# Altium footprint library IC.PcbLib: 108 footprints (part 3 of 8)
Each footprint in its own frame and in the unit in brackets; x right, y up, seen from the top. Pads: shape width x height; smd on the part's side, far side on the other; paste and mask are expansions set on the pad; w line width, h text height; cw(c..) or ccw(c..) is an arc to the next point about the centre after c.
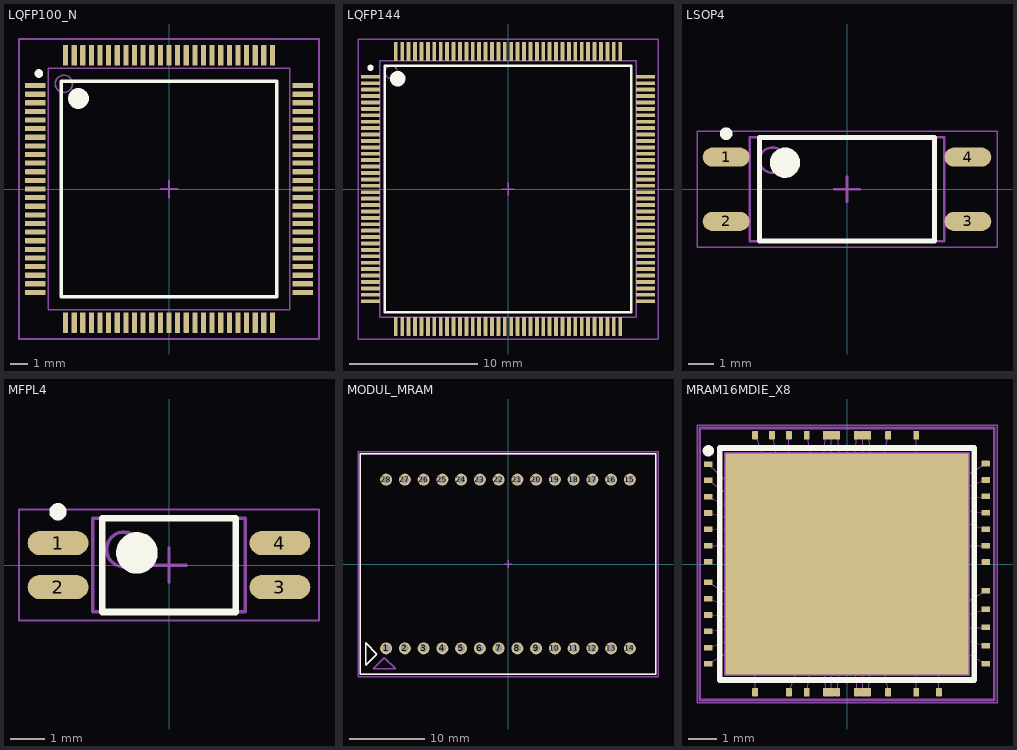
[diagram p2: the footprints below, top view; thin cyan lines are the x and y axes]

## LQFP100_N [mm] "Thin QFP, 100-Leads, Body 14x14mm, Pitch 0.5mm, IPC Medium Density"
height 1.6
pads (100):
  rrect20% 1.2x0.3 smd: 1(-7.75,6) 2(-7.75,5.5) 3(-7.75,5) 4(-7.75,4.5) 5(-7.75,4) 6(-7.75,3.5) 7(-7.75,3) 8(-7.75,2.5) 9(-7.75,2) 10(-7.75,1.5) 11(-7.75,1) 12(-7.75,0.5) 13(-7.75,0) 14(-7.75,-0.5) 15(-7.75,-1) 16(-7.75,-1.5) 17(-7.75,-2) 18(-7.75,-2.5) 19(-7.75,-3) 20(-7.75,-3.5) 21(-7.75,-4) 22(-7.75,-4.5) 23(-7.75,-5) 24(-7.75,-5.5) 25(-7.75,-6) 51(7.75,-6) 52(7.75,-5.5) 53(7.75,-5) 54(7.75,-4.5) 55(7.75,-4) 56(7.75,-3.5) 57(7.75,-3) 58(7.75,-2.5) 59(7.75,-2) 60(7.75,-1.5) 61(7.75,-1) 62(7.75,-0.5) 63(7.75,0) 64(7.75,0.5) 65(7.75,1) 66(7.75,1.5) 67(7.75,2) 68(7.75,2.5) 69(7.75,3) 70(7.75,3.5) 71(7.75,4) 72(7.75,4.5) 73(7.75,5) 74(7.75,5.5) 75(7.75,6)
  rrect20% 0.3x1.2 smd: 26(-6,-7.75) 27(-5.5,-7.75) 28(-5,-7.75) 29(-4.5,-7.75) 30(-4,-7.75) 31(-3.5,-7.75) 32(-3,-7.75) 33(-2.5,-7.75) 34(-2,-7.75) 35(-1.5,-7.75) 36(-1,-7.75) 37(-0.5,-7.75) 38(0,-7.75) 39(0.5,-7.75) 40(1,-7.75) 41(1.5,-7.75) 42(2,-7.75) 43(2.5,-7.75) 44(3,-7.75) 45(3.5,-7.75) 46(4,-7.75) 47(4.5,-7.75) 48(5,-7.75) 49(5.5,-7.75) 50(6,-7.75) 76(6,7.75) 77(5.5,7.75) 78(5,7.75) 79(4.5,7.75) 80(4,7.75) 81(3.5,7.75) 82(3,7.75) 83(2.5,7.75) 84(2,7.75) 85(1.5,7.75) 86(1,7.75) 87(0.5,7.75) 88(0,7.75) 89(-0.5,7.75) 90(-1,7.75) 91(-1.5,7.75) 92(-2,7.75) 93(-2.5,7.75) 94(-3,7.75) 95(-3.5,7.75) 96(-4,7.75) 97(-4.5,7.75) 98(-5,7.75) 99(-5.5,7.75) 100(-6,7.75)
Top Overlay:
  circle w0.25: c-7.55,6.7 r0.125
  circle w0.6: c-5.25,5.25 r0.3
  lines w0.2: -6.25,-6.25 -6.25,6.25 6.25,6.25 6.25,-6.25 -6.25,-6.25
M3_comm_top:
  text ".comment" at -3,-0.5 h2
M5_asm_top:
  circle w0.1: c-6.1,6.1 r0.5
  lines w0.1: -7,-7 -7,7 7,7 7,-7 -7,-7
  text ".Designator" at -2,5.5 h2
M7_courtyard_top:
  lines w0.1: -0.5,0 0.5,0 ; 0,-0.5 0,0.5 ; -8.7,-8.7 -8.7,8.7 8.7,8.7 8.7,-8.7 -8.7,-8.7
3D body "User Library-LQFP100_Grid_0_5.STEP": height 1.6, standoff 0, extent -8,-8 8,8

## LQFP144 [mm] "K1986BE1QI, STM32F407ZET6, TSQFP, 144-Leads, Body 20,00x20,00mm, Pitch 0,50mm, IPC Medium Density"
height 1.6
pads (144):
  rrect20% 1.45x0.3 smd: 1(-10.725,8.75) 2(-10.725,8.25) 3(-10.725,7.75) 4(-10.725,7.25) 5(-10.725,6.75) 6(-10.725,6.25) 7(-10.725,5.75) 8(-10.725,5.25) 9(-10.725,4.75) 10(-10.725,4.25) 11(-10.725,3.75) 12(-10.725,3.25) 13(-10.725,2.75) 14(-10.725,2.25) 15(-10.725,1.75) 16(-10.725,1.25) 17(-10.725,0.75) 18(-10.725,0.25) 19(-10.725,-0.25) 20(-10.725,-0.75) 21(-10.725,-1.25) 22(-10.725,-1.75) 23(-10.725,-2.25) 24(-10.725,-2.75) 25(-10.725,-3.25) 26(-10.725,-3.75) 27(-10.725,-4.25) 28(-10.725,-4.75) 29(-10.725,-5.25) 30(-10.725,-5.75) 31(-10.725,-6.25) 32(-10.725,-6.75) 33(-10.725,-7.25) 34(-10.725,-7.75) 35(-10.725,-8.25) 36(-10.725,-8.75) 73(10.725,-8.75) 74(10.725,-8.25) 75(10.725,-7.75) 76(10.725,-7.25) 77(10.725,-6.75) 78(10.725,-6.25) 79(10.725,-5.75) 80(10.725,-5.25) 81(10.725,-4.75) 82(10.725,-4.25) 83(10.725,-3.75) 84(10.725,-3.25) 85(10.725,-2.75) 86(10.725,-2.25) 87(10.725,-1.75) 88(10.725,-1.25) 89(10.725,-0.75) 90(10.725,-0.25) 91(10.725,0.25) 92(10.725,0.75) 93(10.725,1.25) 94(10.725,1.75) 95(10.725,2.25) 96(10.725,2.75) 97(10.725,3.25) 98(10.725,3.75) 99(10.725,4.25) 100(10.725,4.75) 101(10.725,5.25) 102(10.725,5.75) 103(10.725,6.25) 104(10.725,6.75) 105(10.725,7.25) 106(10.725,7.75) 107(10.725,8.25) 108(10.725,8.75)
  rrect20% 0.3x1.45 smd: 37(-8.75,-10.725) 38(-8.25,-10.725) 39(-7.75,-10.725) 40(-7.25,-10.725) 41(-6.75,-10.725) 42(-6.25,-10.725) 43(-5.75,-10.725) 44(-5.25,-10.725) 45(-4.75,-10.725) 46(-4.25,-10.725) 47(-3.75,-10.725) 48(-3.25,-10.725) 49(-2.75,-10.725) 50(-2.25,-10.725) 51(-1.75,-10.725) 52(-1.25,-10.725) 53(-0.75,-10.725) 54(-0.25,-10.725) 55(0.25,-10.725) 56(0.75,-10.725) 57(1.25,-10.725) 58(1.75,-10.725) 59(2.25,-10.725) 60(2.75,-10.725) 61(3.25,-10.725) 62(3.75,-10.725) 63(4.25,-10.725) 64(4.75,-10.725) 65(5.25,-10.725) 66(5.75,-10.725) 67(6.25,-10.725) 68(6.75,-10.725) 69(7.25,-10.725) 70(7.75,-10.725) 71(8.25,-10.725) 72(8.75,-10.725) 109(8.75,10.725) 110(8.25,10.725) 111(7.75,10.725) 112(7.25,10.725) 113(6.75,10.725) 114(6.25,10.725) 115(5.75,10.725) 116(5.25,10.725) 117(4.75,10.725) 118(4.25,10.725) 119(3.75,10.725) 120(3.25,10.725) 121(2.75,10.725) 122(2.25,10.725) 123(1.75,10.725) 124(1.25,10.725) 125(0.75,10.725) 126(0.25,10.725) 127(-0.25,10.725) 128(-0.75,10.725) 129(-1.25,10.725) 130(-1.75,10.725) 131(-2.25,10.725) 132(-2.75,10.725) 133(-3.25,10.725) 134(-3.75,10.725) 135(-4.25,10.725) 136(-4.75,10.725) 137(-5.25,10.725) 138(-5.75,10.725) 139(-6.25,10.725) 140(-6.75,10.725) 141(-7.25,10.725) 142(-7.75,10.725) 143(-8.25,10.725) 144(-8.75,10.725)
Top Overlay:
  circle w0.25: c-10.725,9.45 r0.125
  circle w0.6: c-8.6,8.6 r0.3
  lines w0.2: -9.6,-9.6 -9.6,9.6 9.6,9.6 9.6,-9.6 -9.6,-9.6
M3_comm_top:
  text ".comment" at -2.95,-0.475 h1
M5_asm_top:
  circle w0.1: c-9.1,9.1 r0.5
  lines w0.1: -10,-10 -10,10 10,10 10,-10 -10,-10
  text ".Designator" at -0.6,12 h1
M7_courtyard_top:
  lines w0.1: -0.5,0 0.5,0 ; 0,-0.5 0,0.5 ; -11.7,-11.7 -11.7,11.7 11.7,11.7 11.7,-11.7 -11.7,-11.7
3D body "TSQFP50P2200X2200X160-144N.step": height 1.6, standoff 0, extent -11,-11 11,11

## LSOP4 [mm] "SOP, IPC Medium Density"
height 2.3
pads (4):
  oval 1.85x0.75 smd: 1(-4.775,1.27) 2(-4.775,-1.27) 3(4.775,-1.27) 4(4.775,1.27)
Top Overlay:
  circle w0.25: c-4.775,2.195 r0.125
  circle w0.6: c-2.45,1.05 r0.3
  lines w0.2: -3.45,-2.05 -3.45,2.05 3.45,2.05 3.45,-2.05 -3.45,-2.05
Mechanical 13:
  circle w0.1: c-2.95,1.15 r0.5
  lines w0.1: -3.85,-2.05 -3.85,2.05 3.85,2.05 3.85,-2.05 -3.85,-2.05
Mechanical 15:
  lines w0.05: -5.925,-2.3 -5.925,2.3 5.925,2.3 5.925,-2.3 -5.925,-2.3
  lines w0.1: -0.5,0 0.5,0 ; 0,-0.5 0,0.5
3D body "LSOP4.step": height 2.3, standoff 0, extent -5.25,-2.05 5.25,2.05

## MFPL4 [mm] "SOP, IPC Medium Density"
height 2.39
pads (4):
  oval 1.75x0.7 smd: 1(-3.2,0.635) 2(-3.2,-0.635) 3(3.2,-0.635) 4(3.2,0.635)
Top Overlay:
  circle w0.25: c-3.2,1.535 r0.125
  circle w0.6: c-0.925,0.35 r0.3
  lines w0.2: -1.925,-1.35 -1.925,1.35 1.925,1.35 1.925,-1.35 -1.925,-1.35
Mechanical 13:
  circle w0.1: c-1.3,0.45 r0.5
  lines w0.1: -2.2,-1.35 -2.2,1.35 2.2,1.35 2.2,-1.35 -2.2,-1.35
Mechanical 15:
  lines w0.05: -4.325,-1.6 -4.325,1.6 4.325,1.6 4.325,-1.6 -4.325,-1.6
  lines w0.1: -0.5,0 0.5,0 ; 0,-0.5 0,0.5
3D body "MFPL4.step": height 2.39, standoff 0, extent -3.65,-1.35 3.65,1.35

## MODUL_MRAM [mm]
pads (28):
  round 1.6 hole 1: 1(-16.25,-11.25) 2(-13.75,-11.25) 3(-11.25,-11.25) 4(-8.75,-11.25) 5(-6.25,-11.25) 6(-3.75,-11.25) 7(-1.25,-11.25) 8(1.25,-11.25) 9(3.75,-11.25) 10(6.25,-11.25) 11(8.75,-11.25) 12(11.25,-11.25) 13(13.75,-11.25) 14(16.25,-11.25) 15(16.25,11.25) 16(13.75,11.25) 17(11.25,11.25) 18(8.75,11.25) 19(6.25,11.25) 20(3.75,11.25) 21(1.25,11.25) 22(-1.25,11.25) 23(-3.75,11.25) 24(-6.25,11.25) 25(-8.75,11.25) 26(-11.25,11.25) 27(-13.75,11.25) 28(-16.25,11.25)
Top Overlay:
  lines w0.2: -19.7,-14.7 -19.7,14.7 19.7,14.7 19.7,-14.7 -19.7,-14.7 ; -19,-13.5 -17.5,-12 -19,-10.5 -19,-13.5
M3_comm_top:
  text ".comment" at -3,-0.5 h2
M5_asm_top:
  lines w0.2: -19.7,-14.7 19.7,-14.7 19.7,14.7 -19.7,14.7 -19.7,-14.7 ; -18,-14 -15,-14 -16.5,-12.5 -18,-14
  text ".Designator" at -3.5,15 h2
M7_courtyard_top:
  lines w0.2: -0.5,0 0.5,0 ; 0,-0.5 0,0.5 ; -20,-15 -20,15 20,15 20,-15 -20,-15
3D body "1210.15-5.STEP": height 1.85, standoff -7.75, extent -19.675,-14.675 19.675,14.675
3D body "lead_1210.15-5.STEP": height 5.8, standoff 1, extent -19.675,-14.65 19.675,14.65

## MRAM16MDIE_X8 [mm] "MRAM16MDIE"
height 1.75
pads (194):
  rrect50% 0.15x0.15 on Mech16: 9(-3.905,-2.95) 9(-3.905,-2.6) 9(-3.905,-2.25) 9(-3.905,-1.9) 9(-3.905,-1.55) 9(-3.905,-1.25) 9(-3.905,-0.95) 9(-3.905,-0.65) 9(-3.905,-0.35) 9(-3.905,0.35) 9(-3.905,0.65) 9(-3.905,0.95) 9(-3.905,1.25) 9(-3.905,1.55) 9(-3.905,1.9) 9(-3.905,2.25) 9(-3.905,2.6) 9(-3.905,2.95) 9(-3.25,-3.53) 9(-3.25,3.53) 9(-2.85,-3.53) 9(-2.85,3.53) 9(-2.45,-3.53) 9(-2.45,3.53) 9(-2.05,-3.53) 9(-2.05,3.53) 9(-1.65,-3.53) 9(-1.65,3.53) 9(-1.25,-3.53) 9(-1.25,3.53) 9(-0.85,-3.53) 9(-0.85,3.53) 9(-0.55,-3.53) 9(-0.55,3.53) 9(-0.25,-3.53) 9(-0.25,3.53) 9(0.25,-3.53) 9(0.25,3.53) 9(0.55,-3.53) 9(0.55,3.53) 9(0.85,-3.53) 9(0.85,3.53) 9(1.25,-3.53) 9(1.25,3.53) 9(1.65,-3.53) 9(1.65,3.53) 9(2.05,-3.53) 9(2.05,3.53) 9(2.45,-3.53) 9(2.45,3.53) 9(2.85,-3.53) 9(2.85,3.53) 9(3.25,-3.53) 9(3.25,3.53) 9(3.905,-2.95) 9(3.905,-2.6) 9(3.905,-2.25) 9(3.905,-1.9) 9(3.905,-1.55) 9(3.905,-1.25) 9(3.905,-0.95) 9(3.905,-0.65) 9(3.905,-0.35) 9(3.905,0.35) 9(3.905,0.65) 9(3.905,0.95) 9(3.905,1.25) 9(3.905,1.55) 9(3.905,1.9) 9(3.905,2.25) 9(3.905,2.6) 9(3.905,2.95)
  rrect20% 0.3x0.2 smd paste-0.15: A2(-4.905,3.53) A3(-4.905,-1.226) A4(-4.905,-1.802) A5(-4.905,-2.378) B3(-4.905,-2.954) B4(-4.905,-3.53) C3(4.9,-3.53) C4(4.905,-2.885) D3(-4.905,1.802) D4(4.905,-2.24) E1(-4.905,0.65) E1(4.91,0.07) E4(-4.905,2.378) E6(-4.905,0.074) E6(4.905,0.65) F3(4.9,3.55) F4(-4.905,2.954) G3(4.905,2.39) G4(4.905,2.97) H1(-4.905,1.226) H2(4.905,-1.595) H3(4.9,-0.95) H4(4.9,1.23) H5(4.905,1.81) H6(-4.9,-0.65)
  rrect20% 0.2x0.3 smd paste-0.15: B5(-3.25,-4.53) C1(2.45,4.55) C6(-2.05,-4.53) D1(-0.75,4.55) D1(-0.55,4.55) D1(-0.35,4.55) D2(1.45,4.55) D5(-1.425,-4.53) D6(0.35,4.55) D6(0.55,4.55) D6(0.75,4.55) E1(-0.75,-4.525) E1(-0.55,-4.53) E1(-0.35,-4.525) E2(-1.425,4.55) E5(1.45,-4.53) E6(0.35,-4.525) E6(0.55,-4.53) E6(0.75,-4.525) F1(-2.65,4.55) F2(-2.05,4.55) F6(2.45,-4.53) G2(-3.25,4.55) G5(3.25,-4.53)
  rrect25% 0.12x0.12 on Mech13: ""(-3.909,2.6) ""(-3.905,-2.95) ""(-3.905,-2.25) ""(-3.905,-1.9) ""(-3.905,-1.55) ""(-3.905,-1.25) ""(-3.905,-0.95) ""(-3.905,-0.65) ""(-3.905,-0.35) ""(-3.905,0.35) ""(-3.905,0.65) ""(-3.905,0.95) ""(-3.905,1.25) ""(-3.905,1.55) ""(-3.905,1.9) ""(-3.905,2.25) ""(-3.905,2.95) ""(-3.9,-2.6) ""(-3.25,-3.53) ""(-3.25,3.53) ""(-2.85,-3.53) ""(-2.85,3.53) ""(-2.45,-3.53) ""(-2.45,3.53) ""(-2.05,-3.53) ""(-2.05,3.53) ""(-1.65,-3.53) ""(-1.65,3.53) ""(-1.25,-3.53) ""(-1.25,3.53) ""(-0.85,-3.53) ""(-0.85,3.53) ""(-0.55,-3.53) ""(-0.55,3.53) ""(-0.25,-3.53) ""(-0.25,3.53) ""(0.25,-3.53) ""(0.25,3.53) ""(0.55,-3.53) ""(0.55,3.53) ""(0.85,-3.53) ""(0.85,3.53) ""(1.25,-3.53) ""(1.25,3.53) ""(1.65,-3.53) ""(1.65,3.53) ""(2.05,-3.53) ""(2.05,3.53) ""(2.45,-3.53) ""(2.45,3.53) ""(2.85,-3.53) ""(2.85,3.53) ""(3.25,-3.53) ""(3.25,3.53) ""(3.9,2.6) ""(3.905,-2.95) ""(3.905,-2.25) ""(3.905,-1.9) ""(3.905,-1.55) ""(3.905,-1.25) ""(3.905,-0.95) ""(3.905,-0.65) ""(3.905,-0.35) ""(3.905,0.35) ""(3.905,0.65) ""(3.905,0.95) ""(3.905,1.25) ""(3.905,1.55) ""(3.905,1.9) ""(3.905,2.25) ""(3.905,2.95) ""(3.909,-2.6)
  rect 8.6x7.8 smd: ""(0,0)
Top Overlay:
  circle w0.2: c-4.9,4 r0.1
  lines w0.2: -4.5,-4.1 -4.5,4.1 4.5,4.1 4.5,-4.1 -4.5,-4.1
M3_comm_top:
  text ".comment" at 0,0 h1
M5_asm_top:
  circle w0.15: c-4.9,4 r0.1
  lines w0.1: -4.5,-4.1 -4.5,4.1 4.5,4.1 4.5,-4.1 -4.5,-4.1
  text ".Designator" at -2,5 h1
M7_courtyard_top:
  lines w0.1: -0.5,0 0.5,0 ; 0,-0.5 0,0.5 ; -5.2,-4.8 -5.2,4.8 5.2,4.8 5.2,-4.8 -5.2,-4.8
Mechanical 13:
  circle w0.1: c-4,3.6 r0.1
  lines w0.01: -4.92,-1.226 -3.905,-1.55 ; -4.905,-3.53 -3.905,-2.95 ; -4.905,-2.953 -3.9,-2.6 ; -4.905,-2.378 -3.905,-2.25 ; -4.905,-1.802 -3.905,-1.9 ; -4.905,0.65 -3.905,0.65 ; -4.905,1.802 -3.905,1.55 ; -4.9,-0.65 -3.905,-1.25 ; -4.89,1.226 -3.905,1.243 ; -4.89,2.378 -3.914,1.899 ; -4.89,2.939 -3.905,2.25 ; -4.89,3.515 -3.909,2.6 ; -3.25,-4.53 -3.25,-3.53 ; -3.25,4.55 -2.85,3.53 ; -2.65,4.55 -2.45,3.53 ; -2.05,-4.53 -1.65,-3.53 ; -2.05,3.53 -2.05,4.55 ; -1.425,-4.53 -1.25,-3.53 ; -1.25,3.53 -1.425,4.55 ; -0.85,-3.53 -0.75,-4.525 ; -0.85,3.53 -0.75,4.55 ; -0.55,-4.53 -0.55,-3.53 ; -0.55,3.53 -0.55,4.55 ; -0.35,-4.525 -0.25,-3.53 ; -0.35,4.55 -0.25,3.53 ; 0.25,-3.53 0.35,-4.525 ; 0.25,3.53 0.35,4.55 ; 0.55,-4.53 0.55,-3.53 ; 0.55,3.53 0.55,4.55 ; 0.75,-4.525 0.85,-3.53 ; 0.75,4.55 0.85,3.53 ; 1.25,-3.53 1.45,-4.53 ; 1.25,3.53 1.45,4.549 ; 2.45,-4.53 2.45,-3.53 ; 2.45,3.53 2.45,4.55 ; 3.25,-4.53 3.25,-3.53 ; 3.9,2.6 4.905,2.97 ; 3.901,-1.902 4.905,-1.595 ; 3.904,-2.955 4.9,-3.53 ; 3.905,-2.25 4.905,-2.25 ; 3.905,-1.55 4.9,-0.95 ; 3.905,0.65 4.905,0.65 ; 3.905,1.55 4.9,1.23 ; 3.905,1.9 4.905,1.81 ; 3.905,2.25 4.905,2.39 ; 3.905,2.95 4.9,3.55 ; 3.909,-2.6 4.905,-2.885 ; -1.425,4.55 -1.425,4.55 ; -1.175,1.325 -1.175,1.6 1.175,1.6 1.175,1.325 ; -1.175,1.325 -1.175,0.65 1.175,0.65 1.175,1.325 ; -1.175,1.325 1.175,1.325
  lines w0.1: -4.3,-3.9 4.3,-3.9 4.3,3.9 -4.3,3.9 -4.3,-3.9
  text "X16" at 0.325,1.15 h0.2
  text "X8 BGA" at 0.325,0.95 h0.2
  text "X8 TSOP" at 0.325,0.75 h0.2
  text "1" at -0.85,0.75 h0.2
  text "0" at -0.175,0.75 h0.2
  text "0" at -0.85,0.95 h0.2
  text "1" at -0.175,0.95 h0.2
  text "0" at -0.85,1.15 h0.2
  text "0" at -0.175,1.15 h0.2
  text "bgax8" at -0.375,1.4 h0.2
  text "tsopx8" at -1.05,1.4 h0.2
  text "vddl" at -2,-3.45 h0.2
  text "ce2b" at -3.824,-1 h0.2
  text "nc_left1" at -3.824,-0.7 h0.2
  text "nc_left0" at -3.824,-0.4 h0.2
  text "vss_x8bga" at -3.824,0.3 h0.2
  text "vdd_x8bga" at -3.824,0.9 h0.2
  text "9" at -3.275,3.625 h0.2
  text "vdd" at 0.9,3.175 h0.2
  text "vdd" at 0.6,3.175 h0.2
  text "vdd" at 0.3,3.175 h0.2
  text "dq1" at 1.3,3.175 h0.2
  text "dq0" at 2.5,3.175 h0.2
  text "a14" at 3.525,2.875 h0.2
  text "a13" at 3.525,2.525 h0.2
  text "a12" at 3.525,2.175 h0.2
  text "a11" at 3.525,1.825 h0.2
  text "a10" at 3.525,1.475 h0.2
  text "vss" at 0.9,-3.45 h0.2
  text "vss" at 0.6,-3.45 h0.2
  text "vss" at 0.3,-3.45 h0.2
  text "vdd" at -0.2,-3.45 h0.2
  text "vdd" at -0.5,-3.45 h0.2
  text "vdd" at -0.8,-3.45 h0.2
  text "dq5" at -1.2,-3.45 h0.2
  text "dq4" at -1.6,-3.45 h0.2
  text "en" at -3.2,-3.45 h0.2
  text "a4" at -3.825,-3 h0.2
  text "a3" at -3.825,-2.65 h0.2
  text "a2" at -3.825,-2.3 h0.2
  text "a1" at -3.825,-1.95 h0.2
  text "a0" at -3.825,-1.6 h0.2
  text "a19" at -3.825,-1.3 h0.2
  text "bgax8" at -3.825,0.6 h0.2
  text "a18" at -3.825,1.2 h0.2
  text "a17" at -3.825,1.5 h0.2
  text "a16" at -3.825,1.85 h0.2
  text "a15" at -3.825,2.2 h0.2
  text "ng" at -3.825,2.55 h0.2
  text "a20" at -2.8,3.175 h0.2
  text "vss" at -0.2,3.175 h0.2
  text "vss" at -0.5,3.175 h0.2
  text "vss" at -0.8,3.175 h0.2
  text "dq2" at -1.2,3.175 h0.2
  text "dq3" at -2.4,3.175 h0.2
  text "dq6" at 1.3,-3.45 h0.2
  text "dq7" at 2.5,-3.45 h0.2
  text "w" at 3.3,-3.45 h0.2
  text "a5" at 3.625,-3.025 h0.2
  text "a6" at 3.625,-2.675 h0.2
  text "a7" at 3.625,-2.325 h0.2
  text "a8" at 3.625,-1.975 h0.2
  text "a9" at 3.625,-1.625 h0.2
  text "tsopx8" at 3.275,0.6 h0.2
  text "1" at -0.275,3.625 h0.2
  text "2" at -0.575,3.625 h0.2
  text "3" at -0.875,3.625 h0.2
  text "4" at -1.275,3.625 h0.2
  text "5" at -1.675,3.625 h0.2
  text "6" at -2.075,3.625 h0.2
  text "7" at -2.475,3.625 h0.2
  text "8" at -2.875,3.625 h0.2
  text "10" at -4.175,2.875 h0.2
  text "11" at -4.175,2.525 h0.2
  text "12" at -4.175,2.175 h0.2
  text "13" at -4.175,1.825 h0.2
  text "14" at -4.175,1.475 h0.2
  text "15" at -4.175,1.175 h0.2
  text "16" at -4.175,0.875 h0.2
  text "17" at -4.175,0.575 h0.2
  text "18" at -4.175,0.275 h0.2
  text "19" at -4.175,-0.425 h0.2
  text "20" at -4.175,-0.725 h0.2
  text "21" at -4.175,-1.025 h0.2
  text "22" at -4.175,-1.325 h0.2
  text "23" at -4.175,-1.625 h0.2
  text "24" at -4.175,-1.975 h0.2
  text "25" at -4.175,-2.325 h0.2
  text "26" at -4.175,-2.675 h0.2
  text "27" at -4.175,-3.025 h0.2
  text "28" at -3.345,-3.75 h0.2
  text "29" at -2.945,-3.75 h0.2
  text "30" at -2.545,-3.75 h0.2
  text "31" at -2.145,-3.75 h0.2
  text "32" at -1.745,-3.75 h0.2
  text "33" at -1.345,-3.75 h0.2
  text "34" at -0.945,-3.75 h0.2
  text "35" at -0.645,-3.75 h0.2
  text "36" at -0.345,-3.75 h0.2
  text "37" at 0.155,-3.75 h0.2
  text "38" at 0.455,-3.75 h0.2
  text "39" at 0.755,-3.75 h0.2
  text "40" at 1.155,-3.75 h0.2
  text "41" at 1.555,-3.75 h0.2
  text "42" at 1.955,-3.75 h0.2
  text "43" at 2.355,-3.75 h0.2
  text "44" at 2.755,-3.75 h0.2
  text "45" at 3.155,-3.75 h0.2
  text "46" at 4,-3.025 h0.2
  text "47" at 4,-2.675 h0.2
  text "48" at 4,-2.325 h0.2
  text "49" at 4,-1.975 h0.2
  text "50" at 4,-1.625 h0.2
  text "51" at 4,-1.325 h0.2
  text "52" at 4,-1.025 h0.2
  text "53" at 4,-0.725 h0.2
  text "54" at 4,-0.425 h0.2
  text "55" at 4,0.275 h0.2
  text "56" at 4,0.575 h0.2
  text "57" at 4,0.875 h0.2
  text "58" at 4,1.175 h0.2
  text "59" at 4,1.475 h0.2
  text "60" at 4,1.825 h0.2
  text "61" at 4,2.175 h0.2
  text "62" at 4,2.525 h0.2
  text "63" at 4,2.875 h0.2
  text "72" at 0.15,3.625 h0.2
  text "71" at 0.45,3.625 h0.2
  text "70" at 0.75,3.625 h0.2
  text "69" at 1.15,3.625 h0.2
  text "68" at 1.55,3.625 h0.2
  text "67" at 1.95,3.625 h0.2
  text "66" at 2.35,3.625 h0.2
  text "65" at 2.75,3.625 h0.2
  text "64" at 3.15,3.625 h0.2
  text "slp" at -2,3.175 h0.2
  text "nUB" at -3.82,2.9 h0.2
  text "nLB" at -3.2,3.15 h0.2
  text "nc_bot" at 2.1,-3.45 h0.2
  text "dbd_b_DC(/ED)" at 2.55,-1.3 h0.2
  text "lvl" at 3.625,-1.025 h0.2
  text "vdd_bot" at 3.175,-0.7 h0.2
  text "opt_bot" at 3.175,-0.4 h0.2
  text "vdd_x8tsop" at 2.9,0.3 h0.2
  text "vss_tsopx8" at 2.899,0.915 h0.2
  text "nc_right" at 3.175,1.2 h0.2
  text "vddl" at 2.1,3.125 h0.2
Mechanical 15:
  lines w0.05: -5.3,-4.9 -5.3,4.9 5.3,4.9 5.3,-4.9 -5.3,-4.9
  lines w0.1: -0.5,0 0.5,0 ; 0,-0.5 0,0.5
3D body: height 0.5, standoff 0.47, extent 3.913,2.597 4.91,2.984
3D body: height 0.49, standoff 0.46, extent 0.735,3.504 0.875,4.552
3D body: height 0.5, standoff 0.47, extent 0.535,3.5 0.565,4.55
3D body: height 0.4, standoff 0, extent -4.3,-3.9 4.3,3.9
3D body: height 0.48, standoff 0, extent -3.265,4.535 -3.235,4.565
3D body: height 0.5, standoff 0.46, extent -3.265,4.535 -3.235,4.565
3D body: height 0.48, standoff 0, extent -2.065,4.535 -2.035,4.565
3D body: height 0.5, standoff 0.46, extent -2.065,4.535 -2.035,4.565
3D body: height 0.48, standoff 0, extent -2.665,4.535 -2.635,4.565
3D body: height 0.5, standoff 0.46, extent -2.665,4.535 -2.635,4.565
3D body: height 0.48, standoff 0, extent -1.44,4.535 -1.41,4.565
3D body: height 0.5, standoff 0.46, extent -1.44,4.535 -1.41,4.565
3D body: height 0.48, standoff 0, extent -0.765,4.535 -0.735,4.565
3D body: height 0.5, standoff 0.46, extent -0.765,4.535 -0.735,4.565
3D body: height 0.48, standoff 0, extent -0.565,4.535 -0.535,4.565
3D body: height 0.5, standoff 0.46, extent -0.565,4.535 -0.535,4.565
3D body: height 0.48, standoff 0, extent -0.365,4.535 -0.335,4.565
3D body: height 0.5, standoff 0.46, extent -0.365,4.535 -0.335,4.565
3D body: height 0.5, standoff 0.46, extent 0.335,4.535 0.365,4.565
3D body: height 0.48, standoff 0, extent 0.335,4.535 0.365,4.565
3D body: height 0.5, standoff 0.46, extent 0.535,4.535 0.565,4.565
3D body: height 0.48, standoff 0, extent 0.535,4.535 0.565,4.565
3D body: height 0.5, standoff 0.46, extent 0.735,4.535 0.765,4.565
3D body: height 0.48, standoff 0, extent 0.735,4.535 0.765,4.565
3D body: height 0.5, standoff 0.46, extent 1.435,4.534 1.465,4.564
3D body: height 0.48, standoff 0, extent 1.435,4.535 1.465,4.564
3D body: height 0.5, standoff 0.46, extent 2.435,4.535 2.465,4.565
3D body: height 0.48, standoff 0, extent 2.435,4.535 2.465,4.565
3D body: height 0.5, standoff 0.46, extent 4.885,3.535 4.915,3.565
3D body: height 0.48, standoff 0, extent 4.89,2.955 4.92,2.985
3D body: height 0.5, standoff 0.46, extent 4.885,1.215 4.915,1.245
3D body: height 0.48, standoff 0, extent 4.89,0.635 4.92,0.665
3D body: height 0.5, standoff 0.46, extent 4.89,2.375 4.92,2.405
3D body: height 0.48, standoff 0, extent 4.89,1.795 4.92,1.825
3D body: height 0.47, standoff 0.46, extent 3.842,-3.012 3.967,-2.887
3D body: height 0.47, standoff 0.46, extent 3.847,-2.662 3.972,-2.537
3D body: height 0.47, standoff 0.46, extent 3.842,-2.312 3.967,-2.187
3D body: height 0.47, standoff 0.46, extent 3.842,-1.962 3.967,-1.837
3D body: height 0.47, standoff 0.46, extent 3.842,-1.612 3.967,-1.487
3D body: height 0.47, standoff 0.46, extent 3.842,-1.312 3.967,-1.187
3D body: height 0.47, standoff 0.46, extent 3.842,-1.012 3.967,-0.887
3D body: height 0.47, standoff 0.46, extent 3.842,-0.712 3.967,-0.587
3D body: height 0.47, standoff 0.46, extent 3.842,-0.412 3.967,-0.287
3D body: height 0.47, standoff 0.46, extent 3.842,0.288 3.967,0.413
3D body: height 0.47, standoff 0.46, extent 3.842,0.588 3.967,0.713
3D body: height 0.47, standoff 0.46, extent 3.842,0.888 3.967,1.013
3D body: height 0.47, standoff 0.46, extent 3.842,1.188 3.967,1.313
3D body: height 0.47, standoff 0.46, extent 3.842,1.488 3.967,1.613
3D body: height 0.47, standoff 0.46, extent 3.842,1.838 3.967,1.963
3D body: height 0.47, standoff 0.46, extent 3.842,2.188 3.967,2.313
3D body: height 0.47, standoff 0.46, extent 3.838,2.538 3.963,2.663
3D body: height 0.47, standoff 0.46, extent 3.842,2.888 3.967,3.013
3D body: height 0.47, standoff 0.46, extent 3.188,3.467 3.313,3.592
3D body: height 0.47, standoff 0.46, extent 2.788,3.467 2.913,3.592
3D body: height 0.47, standoff 0.46, extent 2.388,3.467 2.513,3.592
3D body: height 0.47, standoff 0.46, extent 1.988,3.467 2.113,3.592
3D body: height 0.47, standoff 0.46, extent 1.588,3.467 1.713,3.592
3D body: height 0.47, standoff 0.46, extent 1.188,3.467 1.313,3.592
3D body: height 0.47, standoff 0.46, extent 0.788,3.467 0.913,3.592
3D body: height 0.47, standoff 0.46, extent 0.488,3.467 0.613,3.592
3D body: height 0.47, standoff 0.46, extent 0.188,3.467 0.313,3.592
3D body: height 0.47, standoff 0.46, extent -0.312,3.467 -0.187,3.592
3D body: height 0.47, standoff 0.46, extent -0.612,3.467 -0.487,3.592
3D body: height 0.47, standoff 0.46, extent -0.912,3.467 -0.787,3.592
3D body: height 0.47, standoff 0.46, extent -1.312,3.467 -1.187,3.592
3D body: height 0.47, standoff 0.46, extent -1.712,3.467 -1.587,3.592
3D body: height 0.47, standoff 0.46, extent -3.312,3.467 -3.187,3.592
3D body: height 0.47, standoff 0.46, extent -2.512,3.467 -2.387,3.592
3D body: height 0.47, standoff 0.46, extent -2.912,3.467 -2.787,3.592
3D body: height 0.47, standoff 0.46, extent -2.112,3.467 -1.987,3.592
3D body: height 0.47, standoff 0.46, extent -3.967,2.888 -3.842,3.013
3D body: height 0.47, standoff 0.46, extent -3.972,2.538 -3.847,2.663
3D body: height 0.47, standoff 0.46, extent -3.967,2.188 -3.842,2.313
3D body: height 0.47, standoff 0.46, extent -3.967,1.838 -3.842,1.963
3D body: height 0.47, standoff 0.46, extent -3.967,1.488 -3.842,1.613
3D body: height 0.47, standoff 0.46, extent -3.967,1.188 -3.842,1.313
3D body: height 0.47, standoff 0.46, extent -3.967,0.888 -3.842,1.013
3D body: height 0.47, standoff 0.46, extent -3.967,0.588 -3.842,0.713
3D body: height 0.47, standoff 0.46, extent -3.967,0.288 -3.842,0.413
3D body: height 0.47, standoff 0.46, extent -3.967,-0.412 -3.842,-0.287
3D body: height 0.47, standoff 0.46, extent -3.967,-0.712 -3.842,-0.587
3D body: height 0.47, standoff 0.46, extent -3.967,-1.012 -3.842,-0.887
3D body: height 0.47, standoff 0.46, extent -3.967,-1.312 -3.842,-1.187
3D body: height 0.47, standoff 0.46, extent -3.967,-1.612 -3.842,-1.487
3D body: height 0.47, standoff 0.46, extent -3.967,-1.962 -3.842,-1.837
3D body: height 0.47, standoff 0.46, extent -3.967,-2.312 -3.842,-2.187
3D body: height 0.47, standoff 0.46, extent -3.967,-2.662 -3.842,-2.537
3D body: height 0.47, standoff 0.46, extent -3.967,-3.012 -3.842,-2.887
3D body: height 0.47, standoff 0.46, extent -3.312,-3.592 -3.187,-3.467
3D body: height 0.47, standoff 0.46, extent -2.912,-3.592 -2.787,-3.467
3D body: height 0.47, standoff 0.46, extent -2.512,-3.592 -2.387,-3.467
3D body: height 0.47, standoff 0.46, extent -2.112,-3.592 -1.987,-3.467
3D body: height 0.47, standoff 0.46, extent -1.712,-3.592 -1.587,-3.467
3D body: height 0.47, standoff 0.46, extent -1.312,-3.592 -1.187,-3.467
3D body: height 0.47, standoff 0.46, extent -0.912,-3.592 -0.787,-3.467
3D body: height 0.47, standoff 0.46, extent -0.612,-3.592 -0.487,-3.467
3D body: height 0.47, standoff 0.46, extent -0.312,-3.592 -0.187,-3.467
3D body: height 0.47, standoff 0.46, extent 0.188,-3.592 0.313,-3.467
3D body: height 0.47, standoff 0.46, extent 0.488,-3.592 0.613,-3.467
3D body: height 0.47, standoff 0.46, extent 0.788,-3.592 0.913,-3.467
3D body: height 0.47, standoff 0.46, extent 1.188,-3.592 1.313,-3.467
3D body: height 0.47, standoff 0.46, extent 1.588,-3.592 1.713,-3.467
3D body: height 0.47, standoff 0.46, extent 1.988,-3.592 2.113,-3.467
3D body: height 0.47, standoff 0.46, extent 2.388,-3.592 2.513,-3.467
3D body: height 0.47, standoff 0.46, extent 2.788,-3.592 2.913,-3.467
3D body: height 0.47, standoff 0.46, extent 3.188,-3.592 3.313,-3.467
3D body: height 0.48, standoff 0, extent 3.235,-4.545 3.265,-4.515
3D body: height 0.48, standoff 0, extent 2.435,-4.545 2.465,-4.515
3D body: height 0.48, standoff 0, extent 1.435,-4.545 1.465,-4.515
3D body: height 0.48, standoff 0, extent 0.735,-4.54 0.765,-4.51
3D body: height 0.48, standoff 0, extent 0.535,-4.545 0.565,-4.515
3D body: height 0.48, standoff 0, extent 0.335,-4.54 0.365,-4.51
3D body: height 0.48, standoff 0, extent -0.365,-4.54 -0.335,-4.51
3D body: height 0.48, standoff 0, extent -0.565,-4.545 -0.535,-4.515
3D body: height 0.48, standoff 0, extent -0.765,-4.54 -0.735,-4.51
3D body: height 0.48, standoff 0, extent -1.44,-4.545 -1.41,-4.515
3D body: height 0.48, standoff 0, extent -2.065,-4.545 -2.035,-4.515
3D body: height 0.48, standoff 0, extent -3.265,-4.545 -3.235,-4.515
3D body: height 0.48, standoff 0, extent -4.92,-3.544 -4.89,-3.514
3D body: height 0.48, standoff 0, extent -4.92,-2.968 -4.89,-2.938
3D body: height 0.48, standoff 0, extent -4.92,-2.392 -4.89,-2.362
3D body: height 0.48, standoff 0, extent -4.92,-1.816 -4.89,-1.786
3D body: height 0.48, standoff 0, extent -4.92,-1.24 -4.89,-1.211
3D body: height 0.48, standoff 0, extent -4.915,-0.665 -4.885,-0.635
3D body: height 0.48, standoff 0, extent -4.92,0.635 -4.89,0.665
3D body: height 0.48, standoff 0, extent -4.92,1.211 -4.89,1.241
3D body: height 0.48, standoff 0, extent -4.92,1.787 -4.89,1.817
3D body: height 0.48, standoff 0, extent -4.92,2.363 -4.89,2.393
3D body: height 0.48, standoff 0, extent -4.92,2.939 -4.89,2.969
3D body: height 0.48, standoff 0, extent -4.92,3.515 -4.89,3.545
3D body: height 0.5, standoff 0.46, extent 4.89,1.795 4.92,1.825
3D body: height 0.5, standoff 0.46, extent 4.89,2.955 4.92,2.985
3D body: height 0.5, standoff 0.46, extent -4.92,3.515 -4.89,3.545
3D body: height 0.5, standoff 0.46, extent -4.92,2.939 -4.89,2.969
3D body: height 0.5, standoff 0.46, extent -4.92,2.363 -4.89,2.393
3D body: height 0.5, standoff 0.46, extent -4.92,1.787 -4.89,1.817
3D body: height 0.5, standoff 0.46, extent -4.92,1.211 -4.89,1.241
3D body: height 0.5, standoff 0.46, extent -4.92,0.635 -4.89,0.665
3D body: height 0.5, standoff 0.46, extent -4.915,-0.665 -4.885,-0.635
3D body: height 0.5, standoff 0.46, extent -4.92,-1.24 -4.89,-1.211
3D body: height 0.5, standoff 0.46, extent -4.92,-1.816 -4.89,-1.786
3D body: height 0.5, standoff 0.46, extent -4.92,-2.392 -4.89,-2.362
3D body: height 0.5, standoff 0.46, extent -4.92,-2.968 -4.89,-2.938
3D body: height 0.5, standoff 0.46, extent -4.92,-3.544 -4.89,-3.514
3D body: height 0.5, standoff 0.46, extent -3.265,-4.545 -3.235,-4.515
3D body: height 0.5, standoff 0.46, extent -2.065,-4.545 -2.035,-4.515
3D body: height 0.5, standoff 0.46, extent -1.44,-4.545 -1.41,-4.515
3D body: height 0.5, standoff 0.46, extent -0.765,-4.54 -0.735,-4.51
3D body: height 0.5, standoff 0.46, extent -0.565,-4.545 -0.535,-4.515
3D body: height 0.5, standoff 0.46, extent -0.365,-4.54 -0.335,-4.51
3D body: height 0.5, standoff 0.46, extent 0.335,-4.54 0.365,-4.51
3D body: height 0.5, standoff 0.46, extent 0.535,-4.545 0.565,-4.515
3D body: height 0.5, standoff 0.46, extent 0.735,-4.54 0.765,-4.51
3D body: height 0.5, standoff 0.46, extent 1.435,-4.545 1.465,-4.515
3D body: height 0.5, standoff 0.46, extent 2.435,-4.545 2.465,-4.515
3D body: height 0.5, standoff 0.46, extent 3.235,-4.545 3.265,-4.515
3D body: height 0.5, standoff 0.46, extent 4.89,0.635 4.92,0.665
3D body: height 0.5, standoff 0.46, extent 4.885,1.215 4.915,1.245
3D body: height 0.48, standoff 0, extent 4.885,1.215 4.915,1.245
3D body: height 0.5, standoff 0.46, extent 4.89,2.375 4.92,2.405
3D body: height 0.48, standoff 0, extent 4.89,2.375 4.92,2.405
3D body: height 0.5, standoff 0.46, extent 4.885,3.535 4.915,3.565
3D body: height 0.48, standoff 0, extent 4.885,3.535 4.915,3.565
3D body: height 0.5, standoff 0.47, extent 0.225,3.505 0.365,4.552
3D body: height 0.5, standoff 0.47, extent -0.583,3.5 -0.535,4.551
3D body: height 0.5, standoff 0.47, extent -0.365,3.503 -0.244,4.552
3D body: height 0.5, standoff 0.47, extent -0.875,3.505 -0.735,4.552
3D body: height 0.5, standoff 0.47, extent 1.235,3.516 1.465,4.552
3D body: height 0.5, standoff 0.47, extent -1.44,3.513 -1.228,4.553
3D body: height 0.5, standoff 0.47, extent -2.664,3.517 -2.435,4.553
3D body: height 0.5, standoff 0.47, extent -3.264,3.518 -2.842,4.556
3D body: height 0.5, standoff 0.47, extent -2.065,3.5 -2.035,4.55
3D body: height 0.5, standoff 0.47, extent 2.435,3.5 2.465,4.55
3D body: height 0.5, standoff 0.47, extent 3.907,2.945 4.908,3.563
3D body: height 0.5, standoff 0.47, extent 3.913,2.236 4.907,2.405
3D body: height 0.5, standoff 0.47, extent 3.908,1.795 4.906,1.912
3D body: height 0.5, standoff 0.47, extent 3.897,1.216 4.905,1.569
3D body: height 0.5, standoff 0.47, extent 3.905,0.635 4.905,0.665
3D body: height 0.5, standoff 0.47, extent 3.905,-2.265 4.905,-2.235
3D body: height 0.5, standoff 0.47, extent 3.235,-4.53 3.265,-3.53
3D body: height 0.5, standoff 0.47, extent 2.435,-4.53 2.465,-3.53
3D body: height 0.5, standoff 0.47, extent 1.24,-4.533 1.465,-3.521
3D body: height 0.5, standoff 0.47, extent -1.44,-4.533 -1.232,-3.518
3D body: height 0.5, standoff 0.47, extent -2.064,-4.536 -1.624,-3.505
3D body: height 0.5, standoff 0.47, extent -3.265,-4.53 -3.235,-3.53
3D body: height 0.5, standoff 0.47, extent -4.912,-3.543 -3.901,-2.942
3D body: height 0.5, standoff 0.47, extent -4.91,-2.968 -3.907,-2.598
3D body: height 0.5, standoff 0.47, extent -4.907,-2.392 -3.91,-2.241
3D body: height 0.5, standoff 0.47, extent -4.906,-1.921 -3.909,-1.787
3D body: height 0.5, standoff 0.47, extent -4.909,-1.564 -3.901,-1.211
3D body: height 0.5, standoff 0.47, extent -4.907,-1.255 -3.906,-0.637
3D body: height 0.5, standoff 0.47, extent -4.905,0.635 -3.905,0.665
3D body: height 0.5, standoff 0.47, extent -4.905,1.211 -3.905,1.258
3D body: height 0.5, standoff 0.47, extent -4.908,1.533 -3.882,1.816
3D body: height 0.5, standoff 0.47, extent -4.915,2.598 -3.907,3.541
3D body: height 0.5, standoff 0.47, extent -4.914,2.253 -3.913,2.966
3D body: height 0.5, standoff 0.47, extent -4.911,1.899 -3.902,2.391
3D body: height 0.5, standoff 0.47, extent -0.869,-4.527 -0.735,-3.529
3D body: height 0.5, standoff 0.47, extent -0.565,-4.53 -0.535,-3.53
3D body: height 0.5, standoff 0.47, extent -0.365,-4.527 -0.23,-3.529
3D body: height 0.5, standoff 0.47, extent 0.535,-4.53 0.565,-3.53
3D body: height 0.5, standoff 0.47, extent 0.231,-4.527 0.365,-3.529
3D body: height 0.5, standoff 0.47, extent 0.735,-4.527 0.87,-3.529
3D body: height 0.41, standoff 0.4, extent -4.3,3.25 -3.625,3.9
3D body: height 0.5, standoff 0.47, extent 3.907,-1.555 4.908,-0.937
3D body: height 0.5, standoff 0.47, extent 3.897,-1.916 4.909,-1.581
3D body: height 0.5, standoff 0.47, extent 3.892,-2.899 4.909,-2.581
3D body: height 0.5, standoff 0.47, extent 3.897,-3.542 4.908,-2.942
3D body: height 0.5, standoff 0.46, extent 4.885,-3.544 4.914,-3.514
3D body: height 0.5, standoff 0.46, extent 4.891,-2.9 4.919,-2.869
3D body: height 0.5, standoff 0.46, extent 4.885,-2.392 4.914,-2.362
3D body: height 0.5, standoff 0.46, extent 4.891,-1.61 4.919,-1.58
3D body: height 0.5, standoff 0.46, extent 4.886,-0.965 4.914,-0.935
3D body: height 0.48, standoff 0, extent 4.885,-0.965 4.915,-0.935
3D body: height 0.48, standoff 0, extent 4.89,-1.61 4.92,-1.58
3D body: height 0.48, standoff 0, extent 4.885,-2.392 4.915,-2.362
3D body: height 0.48, standoff 0, extent 4.89,-2.899 4.92,-2.87
3D body: height 0.48, standoff 0, extent 4.885,-3.544 4.915,-3.514